# Altium footprint library 2-Pcblib_Cap.PcbLib: 73 footprints (part 3 of 5)
Each footprint in its own frame and in the unit in brackets; x right, y up, seen from the top. Pads: shape width x height; smd on the part's side, far side on the other; paste and mask are expansions set on the pad; w line width, h text height; cw(c..) or ccw(c..) is an arc to the next point about the centre after c.
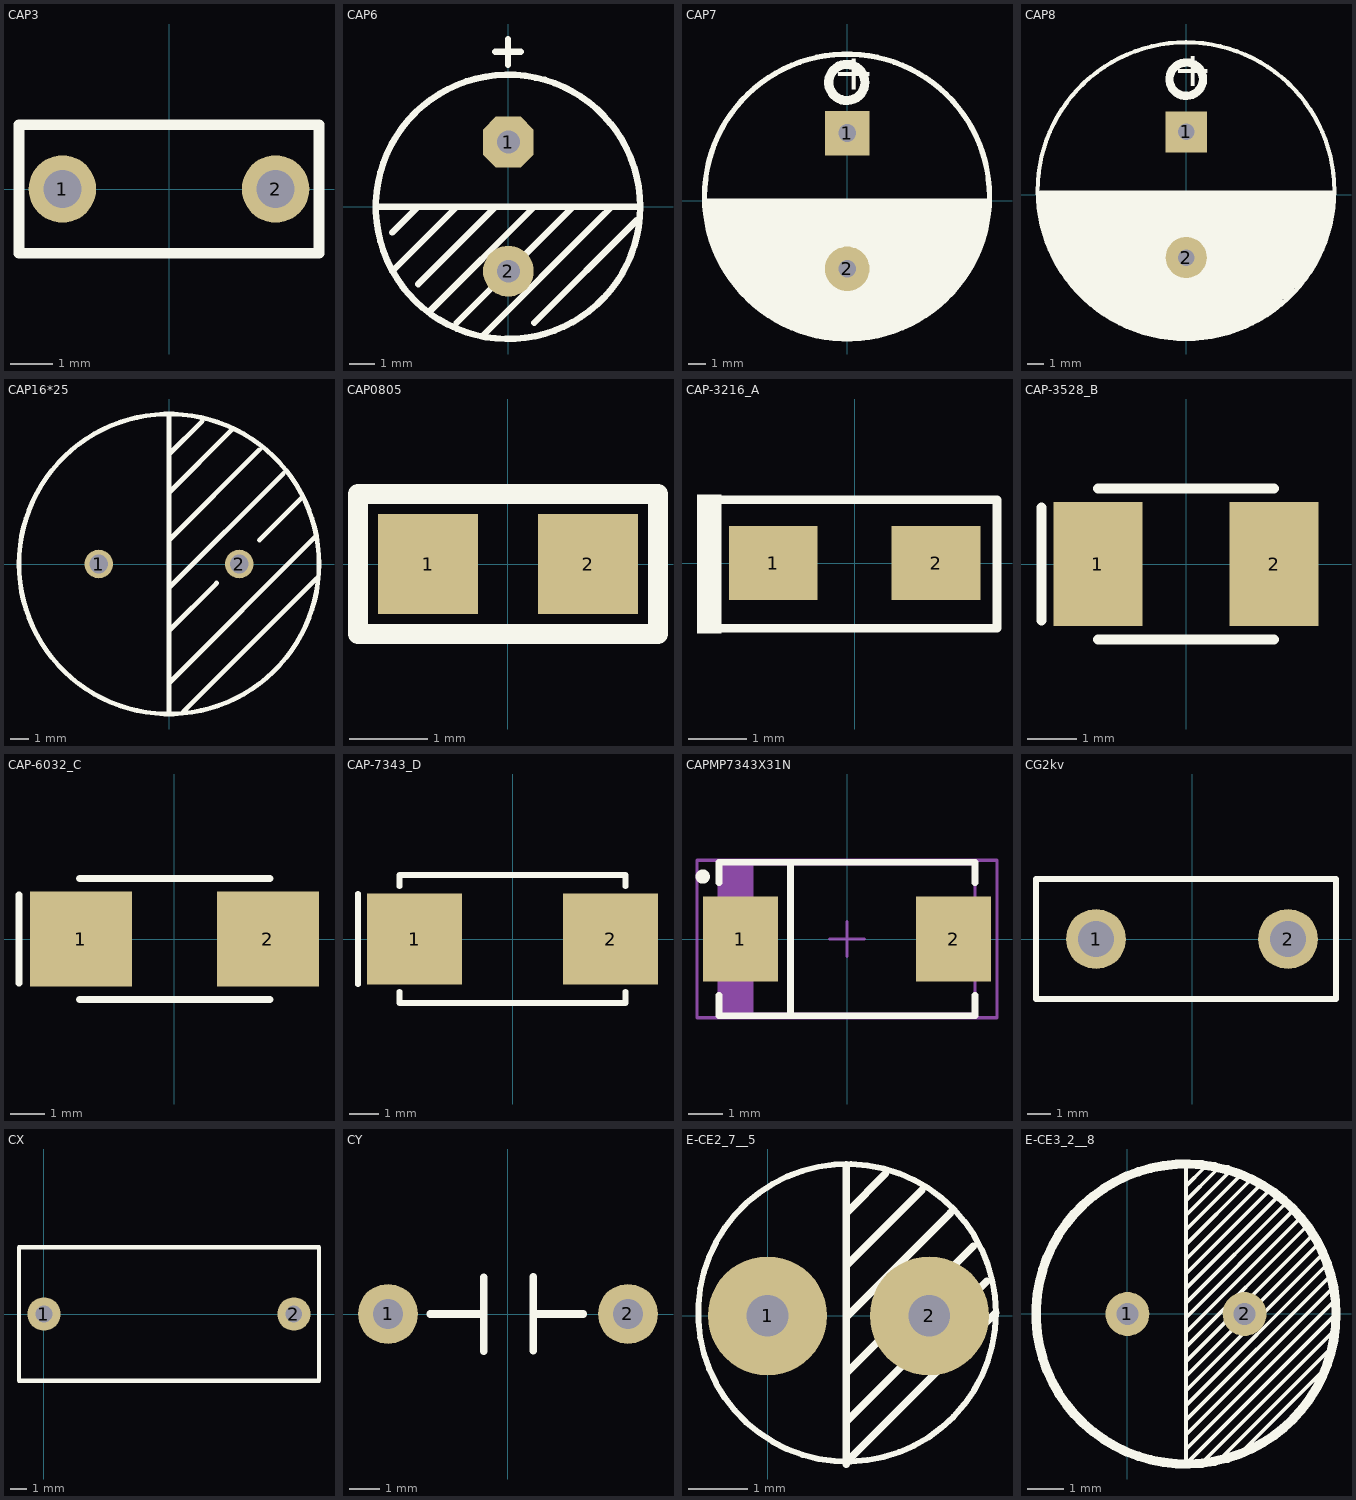
[diagram p2: the footprints below, top view; thin cyan lines are the x and y axes]

## CAP3 [mil]
pads (2):
  round 62 hole 35: 1(-97.92,0) 2(97.92,0)
Top Overlay:
  lines w10: -137.8,-59.06 -137.8,59.06 137.8,59.06 137.8,-59.06 -137.8,-59.06
3D body: height 59.06, standoff -295.28, extent -141.73,-50 141.73,48.43

## CAP6 [mm]
pads (2):
  oct 2x2 hole 0.9: 1(0,2.54)
  round 2 hole 0.9: 2(0,-2.54)
Top Overlay:
  circle w0.254: c-0.013,-0.006 r5.2
  lines w0.254: -5.197,-0.006 5.072,-0.006 ; -5.082,-0.006 -5.075,-0.006 ; -4.567,-2.539 -2.027,0.001 ; -4.567,-1.015 -3.558,-0.006 ; -3.551,-3.047 -0.503,0.001 ; -3.05,-0.006 -3.043,-0.006 ; -3.043,-4.063 1.021,0.001 ; -2.027,-4.571 2.545,0.001 ; -1.011,-5.079 3.561,-0.507 4.069,0.001 ; -0.521,6.09 0.495,6.09 ; -0.013,5.582 -0.013,6.598 ; 1.021,-4.571 5.085,-0.507
3D body: height 26.86, standoff -16, extent -5.03,-5.009 4.978,5.009

## CAP7 [mm]
pads (2):
  rect 2.5x2.5 hole 1: 1(0,3.81)
  round 2.5 hole 1: 2(0,-3.81)
Top Overlay:
  circle w0.3: c-0.013,0.248 r8
  circle w0.508: c-0.025,6.655 r1.016
  lines w0.254: -8.001,0 7.925,0
  lines w0.5: -7.823,-0.787 7.798,-0.787 ; -7.798,-0.33 7.823,-0.33 ; -7.747,-1.168 7.696,-1.168 ; -7.671,-1.626 7.62,-1.626 ; -7.569,-2.032 7.493,-2.032 ; -7.417,-2.464 7.366,-2.464 ; -7.29,-2.743 7.264,-2.743 ; -7.137,-3.099 7.061,-3.099 ; -6.858,-3.454 6.883,-3.454 ; -6.604,-3.861 6.68,-3.861 ; -6.426,-4.191 6.477,-4.191 ; -6.198,-4.547 6.248,-4.547 ; -6.045,-4.801 5.994,-4.801 ; -5.664,-5.232 5.639,-5.232 ; -5.156,-5.563 5.334,-5.563 ; -4.877,-5.842 5.004,-5.842 ; -4.496,-6.096 4.674,-6.096 ; -4.039,-6.426 4.267,-6.376 ; -3.556,-6.655 3.861,-6.604 ; -3.099,-6.883 3.302,-6.883 ; -2.565,-7.137 2.591,-7.137 ; -1.753,-7.391 1.956,-7.391
  text "+" at -0.813,5.537 h3.56
3D body: height 25.7, standoff -2.8, extent -8.169,-8.026 8.331,8.483

## CAP8 [mm]
pads (2):
  rect 2.5x2.5 hole 1: 1(0,3.81)
  round 2.5 hole 1: 2(0,-3.81)
Top Overlay:
  circle w0.508: c0,7.01 r1.016
  circle w0.254: c-0.013,0.248 r9
  lines w0.5: -8.8,0 8.8,0 ; -8.775,-0.991 8.7,-0.991 ; -8.698,-1.397 8.6,-1.397 ; -8.648,-1.753 8.6,-1.753 ; -8.521,-2.159 8.5,-2.159 ; -8.368,-2.515 8.357,-2.515 ; -8.216,-2.896 8.255,-2.896 ; -8.103,-3.251 8.077,-3.251 ; -7.886,-3.632 7.925,-3.632 ; -7.759,-4.039 7.671,-4.039 ; -7.505,-4.42 7.391,-4.42 ; -7.301,-4.75 7.264,-4.75 ; -6.971,-5.055 7.01,-5.055 ; -6.768,-5.41 6.731,-5.41 ; -6.438,-5.766 6.35,-5.766 ; -6.158,-6.096 6.096,-6.096 ; -5.777,-6.502 5.664,-6.502 ; -5.295,-6.858 5.283,-6.858 ; -4.787,-7.188 4.851,-7.188 ; -4.253,-7.493 4.343,-7.493 ; -3.644,-7.849 3.632,-7.849 ; -2.907,-8.103 2.946,-8.103 ; -1.917,-8.382 2.007,-8.382
  lines w1: -8.509,-0.483 8.491,-0.483
  text "+" at -0.787,5.893 h3.56
3D body: height 40.01, standoff -2.7, extent -8.966,-8.763 9.034,9.17

## CAP16*25 [mm]
height 0.6
pads (2):
  round 1.524 hole 1: 1(-3.75,0) 2(3.75,0)
Top Overlay:
  circle w0.254: c0,0 r8
  lines w0.254: 0,-7.874 0,7.874 ; 0,-6.35 7.874,1.524 ; 0,-3.556 2.54,-1.016 ; 0,-1.27 6.096,4.826 ; 0,1.27 4.826,6.096 ; 0,3.81 3.302,7.112 ; 0,5.842 1.778,7.62 ; 0.762,-7.874 7.874,-0.762 ; 4.826,1.27 7.112,3.556
3D body: height 0.8, standoff -25.73, extent -8.013,-7.975 8.017,8.025

## CAP0805 [mil]
pads (2):
  rect 50x50 smd: 1(-40,0) 2(40,0)
Top Overlay:
  lines w10: -75,-35 -75,35 75,35 75,-35 -75,-35
3D body: height 21.65, standoff 0, extent -40.37,-24.8 38.37,24.8

## CAP-3216_A [mil] "钽电容"
height 78.74
pads (2):
  rect 60x50 smd: 1(-55,0) 2(55,0)
Top Overlay:
  region: -90,46.39 -106.46,46.39 -106.46,-47.61 -90,-47.61
  lines w5.91: -94.83,-43.92 96.11,-43.92 96.11,42.69 -94.83,42.69
3D body: height 39.37, standoff 0, extent -65,-30 60.98,32.99

## CAP-3528_B [mm] "钽电容"
height 3
pads (2):
  rect 1.8x2.5 smd: 1(-1.778,0) 2(1.778,0)
Top Overlay:
  lines w0.2: -2.921,-1.143 -2.921,1.143 ; -1.778,1.524 1.778,1.524 ; -1.775,-1.524 1.778,-1.524
3D body: height 2.09, standoff -0.01, extent -1.845,-1.423 1.845,1.397

## CAP-6032_C [mm] "钽电容"
pads (2):
  rect 3x2.8 smd: 1(-2.75,0) 2(2.75,0)
Top Overlay:
  lines w0.2: -4.572,-1.3 -4.572,1.3 ; -2.794,-1.778 2.806,-1.778 ; -2.794,1.778 2.806,1.778
3D body: height 2.8, standoff 0, extent -3.277,-1.722 3.023,1.778

## CAP-7343_D [mm] "钽电容"
height 4
pads (2):
  rect 3.2x3.05 smd: 1(-3.302,0) 2(3.302,0)
Top Overlay:
  lines w0.2: -5.207,-1.524 -5.207,1.524 ; -3.81,-1.778 -3.81,-2.159 3.81,-2.159 3.81,-1.778 ; -3.81,1.778 -3.81,2.159 3.81,2.159 3.81,1.778
3D body: height 2.8, standoff 0, extent -3.746,-2.286 3.746,2.032

## CAPMP7343X31N [mm] "Molded Capacitor, 2-Leads, Body 7"
height 3.1
pads (2):
  rect 2.2x2.5 smd: 1(-3.124,0) 2(3.124,0)
Top Overlay:
  circle w0.2: c-4.225,1.829 r0.11
  lines w0.2: -3.75,-1.65 -3.75,-2.25 3.75,-2.25 3.75,-1.65 ; -3.75,1.65 -3.75,2.25 3.75,2.25 3.75,1.65 ; -1.651,-2.159 -1.651,2.159
Mechanical 13:
  rectangle: -3.747,-2.198 -2.738,2.202
  lines w0.1: -3.75,-2.2 3.75,-2.2 3.75,2.2 -3.75,2.2 -3.75,-2.2
Mechanical 15:
  lines w0.1: -0.5,0 0.5,0 ; 0,-0.5 0,0.5 ; -4.394,-2.311 4.394,-2.311 4.394,2.311 -4.394,2.311 -4.394,-2.311
3D body: height 3.1, standoff 0, extent -3.876,-2.249 3.724,2.351

## CG2kv [mil] "3KV"
height 53.15
pads (2):
  round 100 hole 60: 1(-160,0) 2(160,0)
Top Overlay:
  lines w10: -260,-100 240,-100 240,100 -260,100 -260,-100
3D body: height 394.74, standoff -124.41, extent -160.5,-48.02 154.5,46

## CX [mm] "?"
height 5.08
pads (2):
  round 2 hole 1: 1(0,0) 2(15,0)
Top Overlay:
  lines w0.254: 0,0 0.6,0 ; 16.5,-4 16.5,4 -1.5,4 -1.5,-4 16.505,-4

## CY [mm] "?"
height 5.08
pads (2):
  round 2 hole 1: 1(-4,0) 2(4,0)
Top Overlay:
  lines w0.254: -4,0 -3.4,0 ; -2.591,0 -0.864,0 ; -0.813,-1.245 -0.813,1.219 ; 0.838,-1.219 0.838,1.245 ; 0.965,0 2.515,0 ; 4,0 4,0.2

## E-CE2_7__5 [mm]
height 0.6
pads (2):
  round 2 hole 0.7: 1(0,0) 2(2.718,0)
Top Overlay:
  circle w0.1: c1.335,0.051 r2.5
  lines w0.127: 1.321,-1.753 1.346,-1.753 3.683,0.584 ; 1.321,-0.965 3.454,1.168 ; 1.321,0 1.346,0 3.073,1.727 ; 1.321,0.864 1.346,0.864 2.591,2.108 ; 1.321,1.753 1.346,1.753 1.981,2.388 ; 1.321,2.54 1.321,-2.489 1.321,-2.464 3.835,0.051
3D body: height 11.53, standoff -3.27, extent -1.23,-2.515 3.821,2.536

## E-CE3_2__8 [mm]
height 0.6
pads (2):
  round 1.2 hole 0.6: 1(0,0) 2(3.2,0)
Top Overlay:
  circle w0.254: c1.6,0 r4.1
  lines w0.1: 1.6,-3.7 5.7,0.4 ; 1.6,-3.3 5.6,0.7 ; 1.6,-2.9 5.5,1 ; 1.6,-2.5 5.5,1.4 ; 1.6,-2.1 5.3,1.6 ; 1.6,-1.7 5.2,1.9 ; 1.6,-1.3 5,2.1 ; 1.6,-0.9 4.9,2.4 ; 1.6,-0.5 4.7,2.6 ; 1.6,-0.1 4.5,2.8 ; 1.6,0.3 4.3,3 ; 1.6,0.7 4.1,3.2 ; 1.6,1.1 3.9,3.4 ; 1.6,1.5 3.6,3.5 ; 1.6,1.9 3.3,3.6 ; 1.6,2.3 3.1,3.8 ; 1.6,2.7 2.8,3.9 ; 1.6,3.1 2.4,3.9 ; 1.6,3.5 2.1,4 ; 1.6,4 1.6,-4.1 5.7,0 ; 2,-4.1 5.7,-0.4 ; 2.5,-4 5.6,-0.9 ; 3.1,-3.8 5.3,-1.6
3D body: height 12, standoff -19, extent -2.65,-4.318 5.85,4.182